# Altium footprint library BBC_Footprints.PcbLib: 171 footprints (part 7 of 11)
Each footprint in its own frame and in the unit in brackets; x right, y up, seen from the top. Pads: shape width x height; smd on the part's side, far side on the other; paste and mask are expansions set on the pad; w line width, h text height; cw(c..) or ccw(c..) is an arc to the next point about the centre after c.
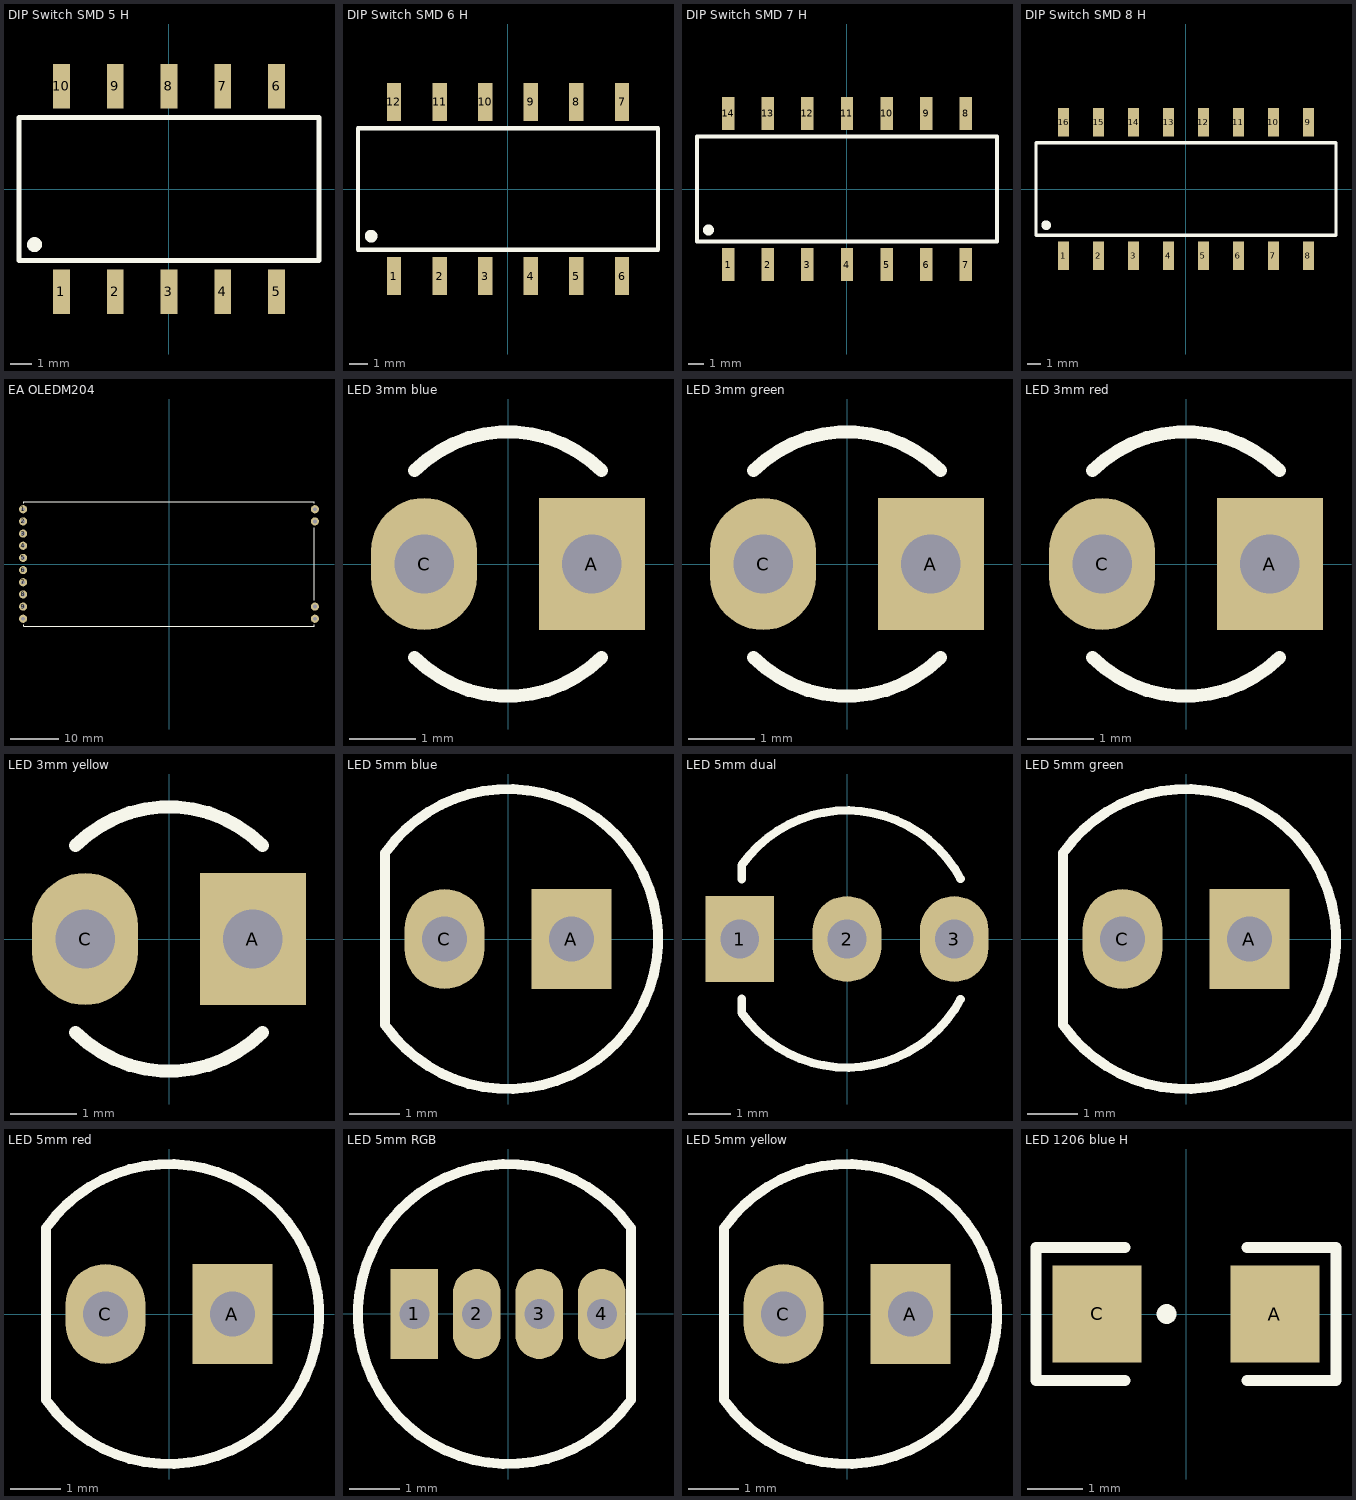
[diagram p6: the footprints below, top view; thin cyan lines are the x and y axes]

## DIP Switch SMD 5 H [mm] "Dipswitch for surface mount / hand soldering"
pads (10):
  rect 0.8x2.1 smd: 1(-5.08,-4.85) 2(-2.54,-4.85) 3(0,-4.85) 4(2.54,-4.85) 5(5.08,-4.85) 6(5.08,4.85) 7(2.54,4.85) 8(0,4.85) 9(-2.54,4.85) 10(-5.08,4.85)
Top Overlay:
  circle w0.5: c-6.35,-2.625 r0.1
  lines w0.25: -7.085,-3.375 -7.085,3.375 7.085,3.375 7.085,-3.375 -7.085,-3.375
3D body "User Library-DIP SW 5P.step": height 4.15, standoff 0, extent -7.085,-4.95 7.085,4.95

## DIP Switch SMD 6 H [mm] "Dipswitch for surface mount / hand soldering"
pads (12):
  rect 0.8x2.1 smd: 1(-6.35,-4.85) 2(-3.81,-4.85) 3(-1.27,-4.85) 4(1.27,-4.85) 5(3.81,-4.85) 6(6.35,-4.85) 7(6.35,4.85) 8(3.81,4.85) 9(1.27,4.85) 10(-1.27,4.85) 11(-3.81,4.85) 12(-6.35,4.85)
Top Overlay:
  circle w0.5: c-7.62,-2.625 r0.1
  lines w0.25: -8.355,-3.375 -8.355,3.375 8.355,3.375 8.355,-3.375 -8.355,-3.375
3D body "User Library-DIP SW 6P.step": height 4.15, standoff 0, extent -8.355,-4.95 8.355,4.95

## DIP Switch SMD 7 H [mm] "Dipswitch for surface mount / hand soldering"
pads (14):
  rect 0.8x2.1 smd: 1(-7.62,-4.85) 2(-5.08,-4.85) 3(-2.54,-4.85) 4(0,-4.85) 5(2.54,-4.85) 6(5.08,-4.85) 7(7.62,-4.85) 8(7.62,4.85) 9(5.08,4.85) 10(2.54,4.85) 11(0,4.85) 12(-2.54,4.85) 13(-5.08,4.85) 14(-7.62,4.85)
Top Overlay:
  circle w0.5: c-8.89,-2.625 r0.1
  lines w0.25: -9.625,-3.375 9.625,-3.375 9.625,3.375 -9.625,3.375 -9.625,-3.375
3D body "User Library-DIP SW 7P.step": height 4.05, standoff -0.1, extent -9.625,-4.95 9.625,4.95

## DIP Switch SMD 8 H [mm] "Dipswitch for surface mount / hand soldering"
pads (16):
  rect 0.8x2.1 smd: 1(-8.89,-4.85) 2(-6.35,-4.85) 3(-3.81,-4.85) 4(-1.27,-4.85) 5(1.27,-4.85) 6(3.81,-4.85) 7(6.35,-4.85) 8(8.89,-4.85) 9(8.89,4.85) 10(6.35,4.85) 11(3.81,4.85) 12(1.27,4.85) 13(-1.27,4.85) 14(-3.81,4.85) 15(-6.35,4.85) 16(-8.89,4.85)
Top Overlay:
  circle w0.5: c-10.16,-2.625 r0.1
  lines w0.25: -10.895,-3.375 -10.895,3.375 10.895,3.375 10.895,-3.375 -10.895,-3.375
3D body "User Library-DIP SW 8P.step": height 4.05, standoff -0.1, extent -10.895,-4.95 10.895,4.95

## EA OLEDM204 [mm]
pads (14):
  round 1.7 hole 0.8: 1(-30.48,11.43) 2(-30.48,8.89) 3(-30.48,6.35) 4(-30.48,3.81) 5(-30.48,1.27) 6(-30.48,-1.27) 7(-30.48,-3.81) 8(-30.48,-6.35) 9(-30.48,-8.89) 10(-30.48,-11.43) 11(30.48,-11.43) 12(30.48,-8.89) 19(30.48,8.89) 20(30.48,11.43)
Top Overlay:
  lines w0.25: -30.33,-13 30.33,-13 ; -30.33,13 30.33,13
  lines w0.254: -30.33,-13 -30.33,-12.7 ; -30.33,12.7 -30.33,13 ; 30.33,-13 30.33,-12.7 ; 30.33,-7.55 30.33,7.55 ; 30.33,12.7 30.33,13
3D body "EA_OLEDM204-LGA.step": height 2.21, standoff -4.7, extent -30.8,-13 30.8,13

## LED 3mm blue [mm] "LED for tht mounting with 3mm diameter"
height 6
pads (2):
  rect 1.6x2 hole 0.9: A(1.27,0)
  oval 1.6x2 hole 0.9: C(-1.27,0)
Top Overlay:
  lines w0.2: -1.414,-1.414 ccw(c0,0) 1.414,-1.414 ; -1.414,1.414 cw(c0,0) 1.414,1.414
3D body "LED 3mm blue.STEP": height 4.68, standoff -2.8, extent -1.55,-1.644 1.664,1.653

## LED 3mm green [mm] "LED for tht mounting with 3mm diameter"
height 6
pads (2):
  rect 1.6x2 hole 0.9: A(1.27,0)
  oval 1.6x2 hole 0.9: C(-1.27,0)
Top Overlay:
  lines w0.2: -1.414,-1.414 ccw(c0,0) 1.414,-1.414 ; -1.414,1.414 cw(c0,0) 1.414,1.414
3D body "LED 3mm green.STEP": height 4.68, standoff -2.8, extent -1.55,-1.644 1.664,1.653

## LED 3mm red [mm] "LED for tht mounting with 3mm diameter"
height 6
pads (2):
  rect 1.6x2 hole 0.9: A(1.27,0)
  oval 1.6x2 hole 0.9: C(-1.27,0)
Top Overlay:
  lines w0.2: -1.414,-1.414 ccw(c0,0) 1.414,-1.414 ; -1.414,1.414 cw(c0,0) 1.414,1.414
3D body "LED 3mm red.STEP": height 4.68, standoff -2.8, extent -1.55,-1.644 1.664,1.653

## LED 3mm yellow [mm] "LED for tht mounting with 3mm diameter"
height 6
pads (2):
  rect 1.6x2 hole 0.9: A(1.27,0)
  oval 1.6x2 hole 0.9: C(-1.27,0)
Top Overlay:
  lines w0.2: -1.414,-1.414 ccw(c0,0) 1.414,-1.414 ; -1.414,1.414 cw(c0,0) 1.414,1.414
3D body "LED 3mm yellow.STEP": height 5.21, standoff -2.79, extent -1.636,-1.646 1.664,1.654

## LED 5mm blue [mm] "LED for tht mounting with 5mm diameter"
height 10
pads (2):
  rect 1.6x2 hole 0.9: A(1.27,0)
  oval 1.6x2 hole 0.9: C(-1.27,0)
Top Overlay:
  lines w0.2: -2.457,-1.721 ccw(c0,0) -2.457,1.721 -2.457,-1.721
3D body "LED 5mm blue.STEP": height 8.61, standoff -3.74, extent -2.44,-3.01 2.98,3.01

## LED 5mm dual [mm] "LED for tht mounting with 5mm diameter"
height 10
pads (3):
  rect 1.6x2 hole 0.9: 1(-2.5,0)
  oval 1.6x2 hole 0.9: 2(0,0) 3(2.5,0)
Top Overlay:
  lines w0.2: -2.457,-1.397 -2.457,-1.721 ccw(c0,0) 2.649,-1.408 ; -2.457,1.397 -2.457,1.721 cw(c0,0) 2.649,1.408
3D body "LED 5mm dual.step": height 8.6, standoff -4, extent -2.74,-2.85 2.85,2.85

## LED 5mm green [mm] "LED for tht mounting with 5mm diameter"
height 10
pads (2):
  rect 1.6x2 hole 0.9: A(1.27,0)
  oval 1.6x2 hole 0.9: C(-1.27,0)
Top Overlay:
  lines w0.2: -2.457,-1.721 ccw(c0,0) -2.457,1.721 -2.457,-1.721
3D body "LED 5mm green.STEP": height 8.61, standoff -2.19, extent -2.44,-3.01 2.98,3.01

## LED 5mm red [mm] "LED for tht mounting with 5mm diameter"
height 10
pads (2):
  rect 1.6x2 hole 0.9: A(1.27,0)
  oval 1.6x2 hole 0.9: C(-1.27,0)
Top Overlay:
  lines w0.2: -2.457,-1.721 ccw(c0,0) -2.457,1.721 -2.457,-1.721
3D body "LED 5mm red.STEP": height 8.61, standoff -2.19, extent -2.44,-3.01 2.98,3.01

## LED 5mm RGB [mm] "LED for tht mounting with 5mm diameter"
height 10
pads (4):
  rect 0.95x1.8 hole 0.6 mask+0.05: 1(-1.875,0)
  oval 0.95x1.8 hole 0.6 mask+0.05: 2(-0.625,0) 3(0.625,0) 4(1.875,0)
Top Overlay:
  lines w0.2: 2.457,-1.721 cw(c0,0) 2.457,1.721 2.457,-1.721
3D body "LED 5mm RGB.step": height 9.7, standoff -3, extent -2.9,-2.9 2.5,2.9

## LED 5mm yellow [mm] "LED for tht mounting with 5mm diameter"
height 10
pads (2):
  rect 1.6x2 hole 0.9: A(1.27,0)
  oval 1.6x2 hole 0.9: C(-1.27,0)
Top Overlay:
  lines w0.2: -2.457,-1.721 ccw(c0,0) -2.457,1.721 -2.457,-1.721
3D body "LED 5mm yellow.STEP": height 8.61, standoff -2.19, extent -2.44,-3.01 2.98,3.01

## LED 1206 blue H [mm] "SMD LED for hand soldering"
height 2
pads (2):
  rect 1.6x1.75 smd: A(1.6,0) C(-1.6,0)
Top Overlay:
  circle w0.254: c-0.35,0 r0.05
  lines w0.2: -1.1,-1.2 -2.7,-1.2 -2.7,1.2 -1.1,1.2 ; 1.1,-1.2 2.7,-1.2 2.7,1.2 1.1,1.2
3D body "LED 1206 blue.step": height 1.1, standoff 0, extent -1.6,-0.8 1.6,0.8